# Altium footprint library TarabusLib_KOR.PcbLib: 560 footprints (part 18 of 35)
Each footprint in its own frame and in the unit in brackets; x right, y up, seen from the top. Pads: shape width x height; smd on the part's side, far side on the other; paste and mask are expansions set on the pad; w line width, h text height; cw(c..) or ccw(c..) is an arc to the next point about the centre after c.
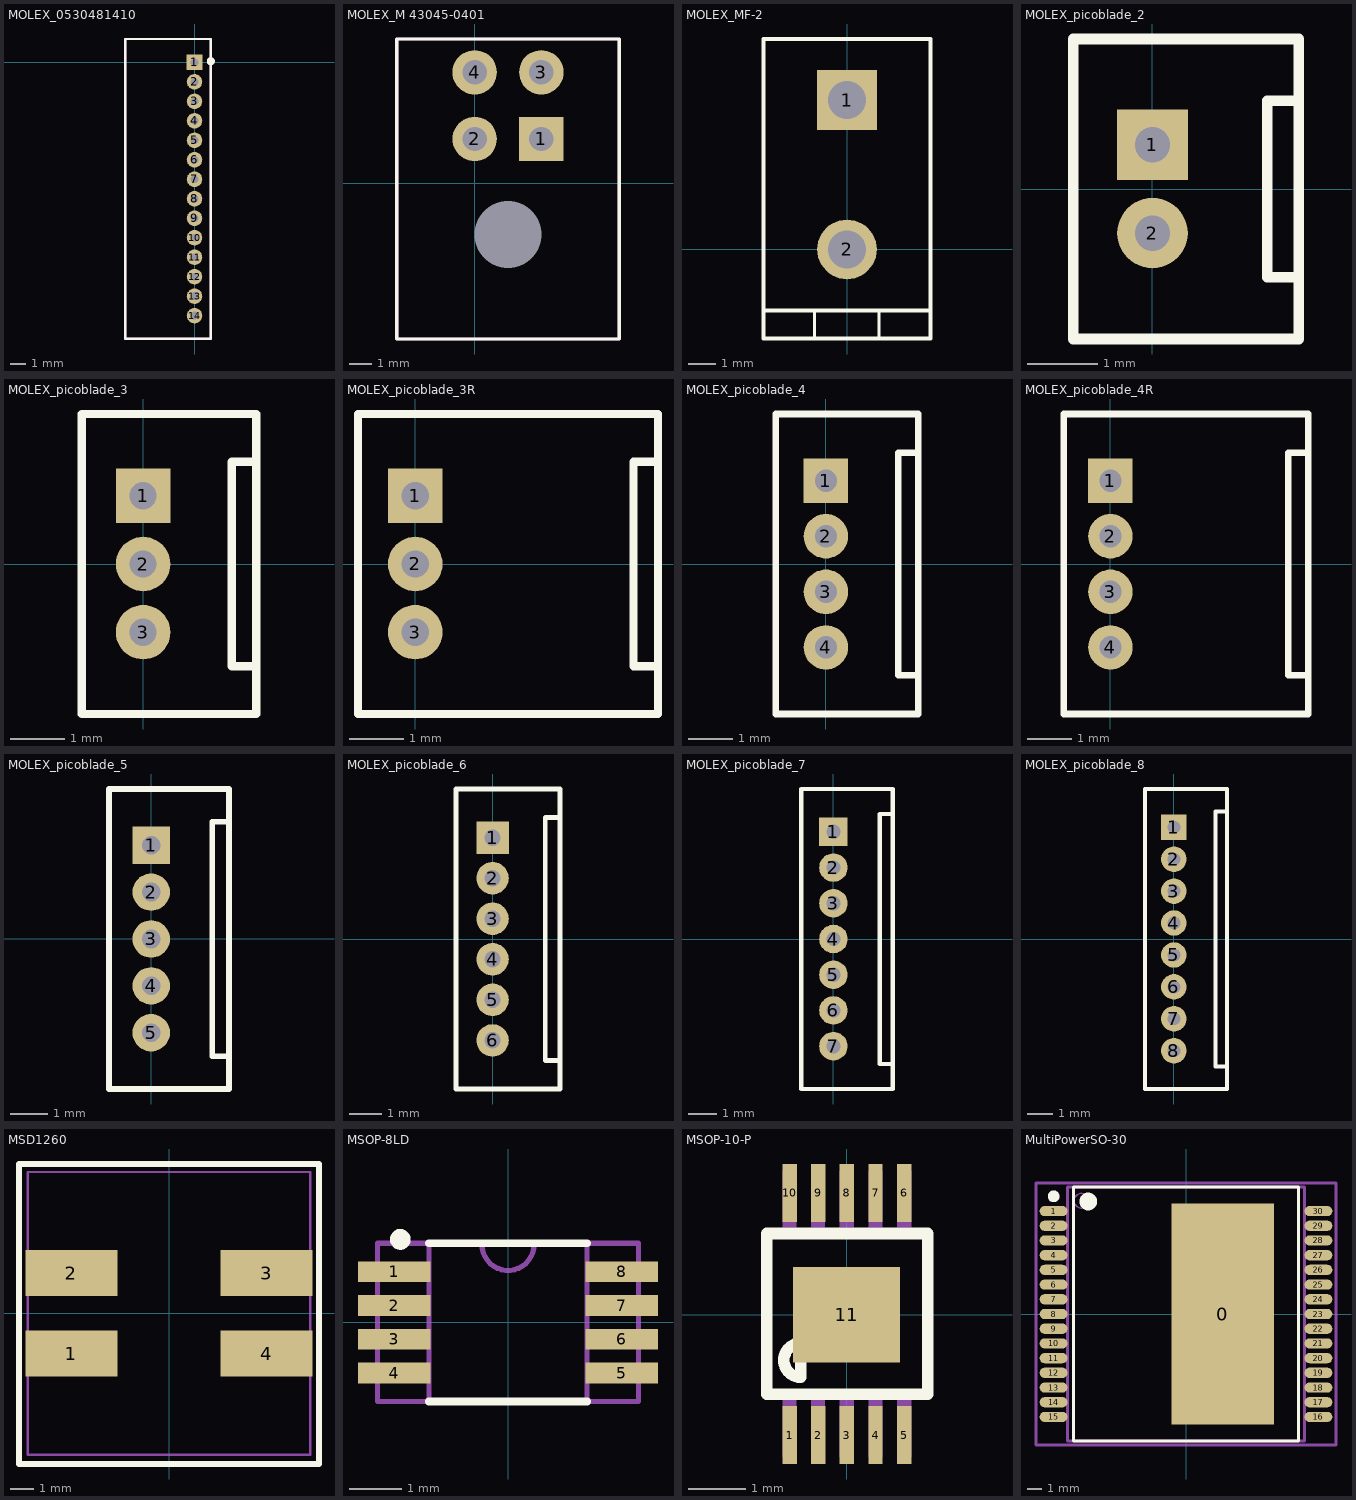
[diagram p17: the footprints below, top view; thin cyan lines are the x and y axes]

## MOLEX_0530481410 [mm]
pads (14):
  rect 1x1 hole 0.5 mask+0.15: 1(0,0)
  round 1 hole 0.5 mask+0.15: 2(0,-1.25) 3(0,-2.5) 4(0,-3.75) 5(0,-5) 6(0,-6.25) 7(0,-7.5) 8(0,-8.75) 9(0,-10) 10(0,-11.25) 11(0,-12.5) 12(0,-13.75) 13(0,-15) 14(0,-16.25)
Top Overlay:
  circle w0.254: c1.048,0.075 r0.127
  lines w0.15: -4.45,-17.725 -4.45,1.5 1.05,1.5 1.05,-17.75 1.025,-17.725 -4.45,-17.725
Mechanical 7:
  lines w0.15: -4.45,-17.725 1.025,-17.725 1.05,-17.75 1.05,1.5 -4.45,1.5 -4.45,-17.725
3D body "User Library-53048-1410.step": height 3.5, standoff -2.4, extent -4.45,-17.75 1.05,1.5

## MOLEX_M 43045-0401 [mm]
pads (5):
  rect 2x2 hole 1.1: 1(3,2)
  round 2 hole 1.1: 2(0,2) 3(3,5) 4(0,5)
  round 1.5 hole 3 unplated: ""(1.5,-2.3)
Top Overlay:
  lines w0.15: -3.5,-7 -3.5,6.5 6.5,6.5 6.5,-7 -3.5,-7
Mechanical 9:
  text ".Comment" at 0.23,-5.59 h0.6
  text ".Designator" at 0.22,-5.02 h0.8
Mechanical 11:
  lines w0.15: -3.5,-7 -3.5,6.5 6.5,6.5 6.5,-7 -3.5,-7
3D body "Micro-Fit 3.0.STEP": height 8.83, standoff -3.12, extent -3.575,-6.95 6.575,5.29

## MOLEX_MF-2 [mm]
pads (2):
  rect 2.2x2.2 hole 1.4: 1(0,5.5)
  round 2.2 hole 1.4: 2(0,0)
Top Overlay:
  lines w0.1: -1.2,-3.275 -1.2,-2.25 ; 1.175,-3.275 1.175,-2.25 ; 1.2,-3.275 1.225,-3.3
  lines w0.15: -3.075,-2.25 3.075,-2.25 ; -3.075,-3.275 -3.075,7.75 3.075,7.75 3.075,-3.275 -3.075,-3.275
Mechanical 7:
  lines w0.1: -3.075,-2.25 3.075,-2.25 3.075,7.75 -3.075,7.75 -3.075,-2.25
Mechanical 10:
  text ".Comment" at -1.27,4.41 h0.6
  text ".Designator" at -1.28,4.98 h0.8
3D body "039281023.stp": height 12.8, standoff -3.5, extent -3.1,-3.2 3.1,7.8

## MOLEX_picoblade_2 [mm]
height 4.2
pads (2):
  rect 1x1 hole 0.5 mask+0.15: 1(0,0.625)
  round 1 hole 0.5 mask+0.15: 2(0,-0.625)
Top Overlay:
  lines w0.15: 2.075,-1.25 1.625,-1.25 1.625,1.25 2.075,1.25 ; -1.125,-2.125 -1.125,2.125 2.075,2.125 2.075,-2.125 -1.125,-2.125
Mechanical 9:
  text ".Comment" at -0.77,2.485 h0.6
  text ".Designator" at -0.78,3.055 h0.8
Mechanical 11:
  lines w0.1: 2.075,-1.25 1.625,-1.25 1.625,1.25 2.075,1.25 ; -1.125,-2.125 2.075,-2.125 2.075,2.125 -1.125,2.125 -1.125,-2.125
3D body "530470210.STEP": height 4.22, standoff -2.18, extent -1.125,-2.125 2.075,2.125

## MOLEX_picoblade_3 [mm]
height 4.2
pads (3):
  rect 1x1 hole 0.5 mask+0.15: 1(0,1.25)
  round 1 hole 0.5 mask+0.15: 2(0,0) 3(0,-1.25)
Top Overlay:
  lines w0.15: 2.075,-1.875 1.625,-1.875 1.625,1.875 2.075,1.875 ; -1.125,-2.75 2.075,-2.75 2.075,2.75 -1.125,2.75 -1.125,-2.75
Mechanical 9:
  text ".Designator" at -0.78,3.68 h0.8
  text ".Comment" at -0.77,3.11 h0.6
Mechanical 11:
  lines w0.1: 2.075,-1.875 1.625,-1.875 1.625,1.875 2.075,1.875 ; -1.125,-2.75 2.075,-2.75 2.075,2.75 -1.125,2.75 -1.125,-2.75
3D body "530470310.STEP": height 4.22, standoff -2.18, extent -1.125,-2.75 2.075,2.75

## MOLEX_picoblade_3R [mm]
height 3.5
pads (3):
  rect 1x1 hole 0.5 mask+0.15: 1(0,1.25)
  round 1 hole 0.5 mask+0.15: 2(0,0) 3(0,-1.25)
Top Overlay:
  lines w0.15: 4.45,-1.875 4,-1.875 4,1.875 4.45,1.875 ; -1.05,-2.75 4.45,-2.75 4.45,2.75 -1.05,2.75 -1.05,-2.75
Mechanical 7:
  lines w0.1: 4.45,-1.875 4,-1.875 4,1.875 4.45,1.875 ; -1.05,-2.75 4.45,-2.75 4.45,2.75 -1.05,2.75 -1.05,-2.75
Mechanical 10:
  text ".Designator" at 0.595,3.73 h0.8
  text ".Comment" at 0.605,3.16 h0.6
3D body "530480310.STEP": height 3.51, standoff -2.29, extent -1.05,-2.75 4.45,2.75

## MOLEX_picoblade_4 [mm]
height 4.2
pads (4):
  rect 1x1 hole 0.5 mask+0.15: 1(0,1.875)
  round 1 hole 0.5 mask+0.15: 2(0,0.625) 3(0,-0.625) 4(0,-1.875)
Top Overlay:
  lines w0.15: 2.075,-2.5 1.625,-2.5 1.625,2.5 2.075,2.5 ; -1.125,-3.375 -1.125,3.375 2.075,3.375 2.075,-3.375 -1.125,-3.375
Mechanical 7:
  lines w0.1: 2.075,-2.5 1.625,-2.5 1.625,2.5 2.075,2.5 ; -1.125,-3.375 -1.125,3.375 2.075,3.375 2.075,-3.375 -1.125,-3.375
Mechanical 10:
  text ".Comment" at -0.77,3.735 h0.6
  text ".Designator" at -0.78,4.305 h0.8
3D body "530470410.STEP": height 4.22, standoff -2.18, extent -1.125,-3.375 2.075,3.375

## MOLEX_picoblade_4R [mm]
height 3.5
pads (4):
  rect 1x1 hole 0.5 mask+0.15: 1(0,1.875)
  round 1 hole 0.5 mask+0.15: 2(0,0.625) 3(0,-0.625) 4(0,-1.875)
Top Overlay:
  lines w0.15: 4.45,-2.5 4,-2.5 4,2.5 4.45,2.5 ; -1.05,-3.375 4.45,-3.375 4.45,3.375 -1.05,3.375 -1.05,-3.375
Mechanical 7:
  lines w0.1: 4.45,-2.5 4,-2.5 4,2.5 4.45,2.5 ; -1.05,-3.375 -1.05,3.375 4.45,3.375 4.45,-3.375 -1.05,-3.375
Mechanical 10:
  text ".Designator" at 0.595,4.355 h0.8
  text ".Comment" at 0.605,3.785 h0.6
3D body "530480410_grey.STEP": height 3.51, standoff -2.29, extent -1.05,-3.375 4.45,3.375

## MOLEX_picoblade_5 [mm]
height 4.2
pads (5):
  rect 1x1 hole 0.5 mask+0.15: 1(0,2.5)
  round 1 hole 0.5 mask+0.15: 2(0,1.25) 3(0,0) 4(0,-1.25) 5(0,-2.5)
Top Overlay:
  lines w0.15: 2.075,-3.125 1.625,-3.125 1.625,3.125 2.075,3.125 ; -1.125,-4 2.075,-4 2.075,4 -1.125,4 -1.125,-4
Mechanical 7:
  lines w0.1: 2.075,-3.125 1.625,-3.125 1.625,3.125 2.075,3.125 ; -1.125,-4 2.075,-4 2.075,4 -1.125,4 -1.125,-4
Mechanical 10:
  text ".Designator" at -0.78,4.93 h0.8
  text ".Comment" at -0.77,4.36 h0.6
3D body "530470510.STEP": height 4.22, standoff -2.18, extent -1.125,-4 2.075,4

## MOLEX_picoblade_6 [mm]
height 4.2
pads (6):
  rect 1x1 hole 0.5 mask+0.15: 1(0,3.125)
  round 1 hole 0.5 mask+0.15: 2(0,1.875) 3(0,0.625) 4(0,-0.625) 5(0,-1.875) 6(0,-3.125)
Top Overlay:
  lines w0.15: 2.075,-3.75 1.625,-3.75 1.625,3.75 2.075,3.75 ; -1.125,-4.625 2.075,-4.625 2.075,4.625 -1.125,4.625 -1.125,-4.625
Mechanical 9:
  text ".Designator" at -0.78,5.555 h0.8
  text ".Comment" at -0.77,4.985 h0.6
Mechanical 11:
  lines w0.1: 2.075,-3.75 1.625,-3.75 1.625,3.75 2.075,3.75 ; -1.125,-4.625 2.075,-4.625 2.075,4.625 -1.125,4.625 -1.125,-4.625
3D body "530470610.STEP": height 4.22, standoff -2.18, extent -1.125,-4.625 2.075,4.625

## MOLEX_picoblade_7 [mm]
height 4.2
pads (7):
  rect 1x1 hole 0.5 mask+0.15: 1(0,3.75)
  round 1 hole 0.5 mask+0.15: 2(0,2.5) 3(0,1.25) 4(0,0) 5(0,-1.25) 6(0,-2.5) 7(0,-3.75)
Top Overlay:
  lines w0.15: 2.075,-4.375 1.625,-4.375 1.625,4.375 2.075,4.375 ; -1.125,-5.25 -1.125,5.25 2.075,5.25 2.075,-5.25 -1.125,-5.25
Mechanical 7:
  lines w0.1: 2.075,-4.375 1.625,-4.375 1.625,4.375 2.075,4.375 ; -1.125,-5.25 -1.125,5.25 2.075,5.25 2.075,-5.25 -1.125,-5.25
Mechanical 10:
  text ".Comment" at -0.77,5.61 h0.6
  text ".Designator" at -0.78,6.18 h0.8
3D body "530470710.STEP": height 4.22, standoff -2.18, extent -1.125,-5.25 2.075,5.25

## MOLEX_picoblade_8 [mm]
height 4.2
pads (8):
  rect 1x1 hole 0.5 mask+0.15: 1(0,4.375)
  round 1 hole 0.5 mask+0.15: 2(0,3.125) 3(0,1.875) 4(0,0.625) 5(0,-0.625) 6(0,-1.875) 7(0,-3.125) 8(0,-4.375)
Top Overlay:
  lines w0.15: 2.075,-5 1.625,-5 1.625,5 2.075,5 ; -1.125,-5.875 -1.125,5.875 2.075,5.875 2.075,-5.875 -1.125,-5.875
Mechanical 7:
  lines w0.1: 2.075,-5 1.625,-5 1.625,5 2.075,5 ; -1.125,-5.875 -1.125,5.875 2.075,5.875 2.075,-5.875 -1.125,-5.875
Mechanical 10:
  text ".Comment" at -0.77,6.235 h0.6
  text ".Designator" at -0.78,6.805 h0.8
3D body "530470810.STEP": height 4.22, standoff -2.18, extent -1.125,-5.875 2.075,5.875

## MSD1260 [mm]
height 6
pads (4):
  rect 4x2 smd mask+0.075: 1(-4.25,-1.75) 2(-4.25,1.75) 3(4.25,1.75) 4(4.25,-1.75)
Top Overlay:
  lines w0.254: -6.525,-6.55 -6.525,6.5 6.525,6.5 6.525,-6.55 -6.525,-6.55
Mechanical 7:
  lines w0.1: -6.15,-6.15 -6.15,6.15 6.15,6.15 6.15,-6.15 -6.15,-6.15
Mechanical 10:
  text ".Designator" at -1.225,-7.75 h0.8
  text ".Comment" at -1.4,7.725 h0.8
3D body: height 6, standoff 0, extent -6.15,-6.15 6.15,6.15

## MSOP-8LD [mm]
height 0.9
pads (8):
  rect 1.4x0.4 smd: 1(-2.19,0.975) 2(-2.19,0.325) 3(-2.19,-0.325) 4(-2.19,-0.975) 5(2.19,-0.975) 6(2.19,-0.325) 7(2.19,0.325) 8(2.19,0.975)
Top Overlay:
  circle w0.2: c-2.075,1.6 r0.1
  lines w0.15: -1.525,-1.525 1.525,-1.525 ; -1.525,1.525 1.525,1.525
Mechanical 7:
  lines w0.1: -1.525,-1.525 -1.525,1.525 ; -0.499,1.525 ccw(c0,1.5) 0.499,1.525 ; 1.525,-1.525 1.525,1.525 ; -2.515,-1.525 -2.515,1.525 2.515,1.525 2.515,-1.525 -2.515,-1.525
Mechanical 10:
  text ".Comment" at -0.67,-2.26 h0.6
  text ".Designator" at -0.67,2.04 h0.8
3D body: height 0.7, standoff 0, extent -2.515,-1.525 -1.525,1.525
3D body: height 0.7, standoff 0, extent 1.525,-1.525 2.515,1.525
3D body: height 1.11, standoff 0, extent -1.525,-1.525 1.525,1.525

## MSOP-10-P [mil]
pads (11):
  rect 10x40 smd: 1(-39.37,-83.19) 2(-19.68,-83.19) 3(0,-83.19) 4(20,-83.19) 5(40,-83.19) 6(40,84) 7(20,84) 8(0,84) 9(-19.68,84) 10(-39.37,84)
  rect 74x66 smd: 11(0,0)
Top Overlay:
  lines w8: -55.12,-55.12 -55.12,56 56,56 56,-55.12 -55.12,-55.12 ; -31.5,-43.31 cw(c-31.5,-31.5) -31.5,-19.68 -31.5,-43.31
Mechanical 16:
  region: -34.47,99 -44.31,99 -44.31,60 -34.47,60
  region: -14.79,99 -24.63,99 -24.63,60 -14.79,60
  region: 5,99 -4.94,99 -4.94,60 5,60
  region: 25,99 15,99 15,60 25,60
  region: 45,99 35,99 35,60 45,60
  rectangle: 35,-98.43 45,-59.06
  rectangle: 15,-98.43 25,-59.06
  rectangle: -4.9,-98.43 5,-59.06
  rectangle: -24.58,-98.43 -14.74,-59.06
  rectangle: -44.27,-98.43 -34.43,-59.06

## MultiPowerSO-30 [mm] "SOIC, 30-Leads, Body 17,20x16,00mm, Pitch 1mm, IPC Medium Density"
height 2.35
pads (31):
  rect 7x15 smd: 0(2.5,0)
  oval 1.9x0.7 smd: 1(-9,7) 2(-9,6) 3(-9,5) 4(-9,4) 5(-9,3) 6(-9,2) 7(-9,1) 8(-9,0) 9(-9,-1) 10(-9,-2) 11(-9,-3) 12(-9,-4) 13(-9,-5) 14(-9,-6) 15(-9,-7) 16(9,-7) 17(9,-6) 18(9,-5) 19(9,-4) 20(9,-3) 21(9,-2) 22(9,-1) 23(9,0) 24(9,1) 25(9,2) 26(9,3) 27(9,4) 28(9,5) 29(9,6) 30(9,7)
Top Overlay:
  circle w0.6: c-6.65,7.65 r0.3
  circle w0.4: c-9,8 r0.2
  lines w0.2: -7.65,-8.65 7.65,-8.65 7.65,8.65 -7.65,8.65 -7.65,-8.65
Mechanical 7:
  circle w0.1: c-7.1,7.7 r0.5
  lines w0.1: -0.5,0 0.5,0 ; 0,-0.5 0,0.5
  lines w0.2: -10.2,-8.9 10.2,-8.9 10.2,8.9 -10.2,8.9 -10.2,-8.9 ; -8.05,-8.65 8.05,-8.65 8.05,8.65 -8.05,8.65 -8.05,-8.65
Mechanical 9:
  text ".Comment" at -7.68,4.705 h0.6
  text ".Designator" at -7.8,5.355 h0.8
3D body "SW3dPS-PowSO30.STEP": height 2.37, standoff -0.09, extent -9.775,-8.6 9.225,8.6